# Altium footprint library vertigo.PcbLib: 115 footprints (part 2 of 8)
Each footprint in its own frame and in the unit in brackets; x right, y up, seen from the top. Pads: shape width x height; smd on the part's side, far side on the other; paste and mask are expansions set on the pad; w line width, h text height; cw(c..) or ccw(c..) is an arc to the next point about the centre after c.
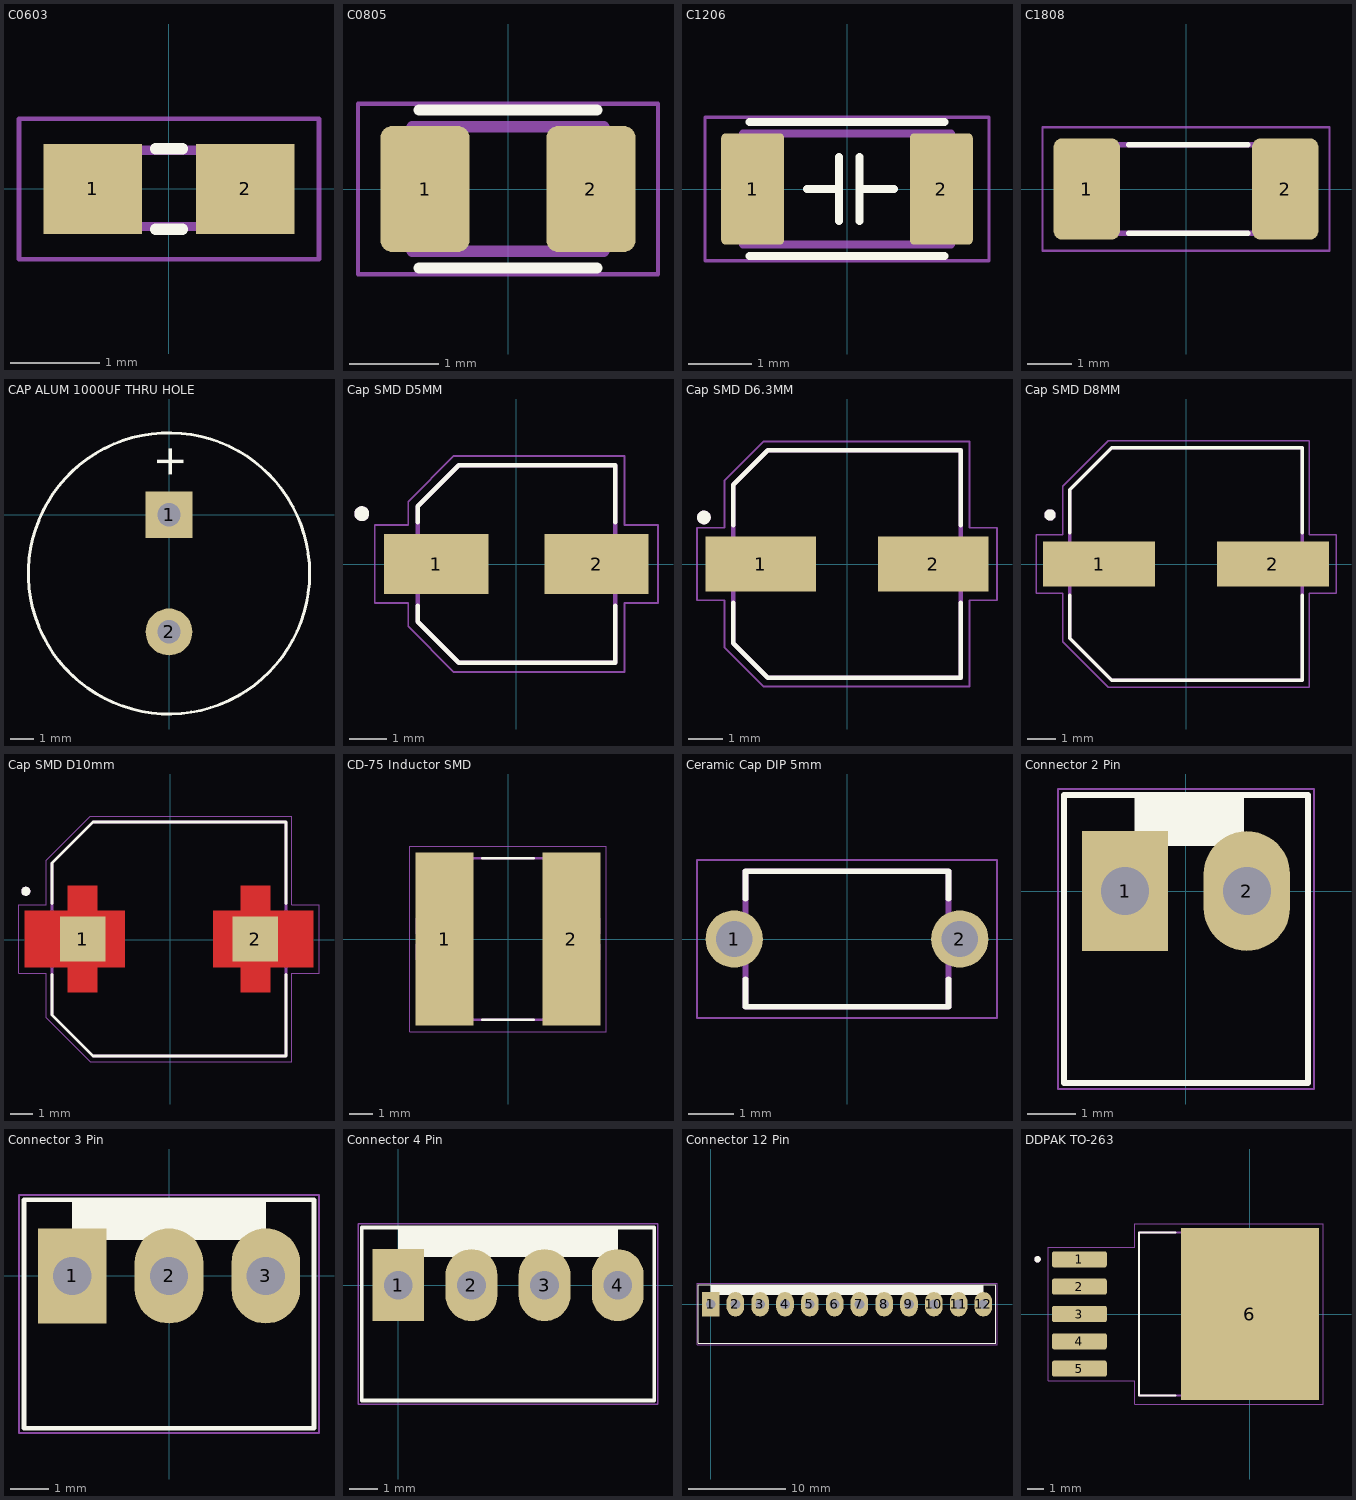
[diagram p1: the footprints below, top view; thin cyan lines are the x and y axes]

## C0603 [mm] "0603 SMD Package"
pads (2):
  rect 1.1x1 smd: 1(-0.85,0) 2(0.85,0)
Top Overlay:
  lines w0.127: -0.15,-0.45 0.15,-0.45 ; -0.15,0.45 0.15,0.45
Mechanical 13:
  region: -0.338,-0.47 -0.839,-0.47 -0.839,0.48 -0.338,0.48
  region: 0.83,-0.471 0.331,-0.471 0.331,0.48 0.83,0.48
  lines w0.102: -0.356,-0.419 0.356,-0.419 ; -0.356,0.432 0.356,0.432
Mechanical 15:
  lines w0.051: -1.673,-0.783 1.673,-0.783 1.673,0.783 -1.673,0.783 -1.673,-0.783
3D body "LD034C222KAB2A.STEP": height 0.41, standoff -0.41, extent -0.8,-0.419 0.8,0.481

## C0805 [mm]
pads (2):
  rrect25% 1x1.42 smd: 1(-0.935,0) 2(0.935,0)
Top Overlay:
  lines w0.127: -1,-0.89 1,-0.89 ; -1,0.89 1,0.89
Mechanical 13:
  lines w0.127: -1.08,-0.7 -1.08,0.7 1.08,0.7 1.08,-0.7 -1.08,-0.7
Mechanical 15:
  lines w0.05: -1.69,-0.96 -1.69,0.96 1.69,0.96 1.69,-0.96 -1.69,-0.96
3D body "LD051C473KAB2A(0.STEP": height 0.94, standoff 0, extent -1.005,-0.625 1.005,0.625

## C1206 [mm] "1206 Package"
pads (2):
  rrect14% 1x1.77 smd: 1(-1.5,0) 2(1.5,0)
Top Overlay:
  lines w0.127: -1.55,-1.065 1.55,-1.065 ; -1.55,1.065 1.55,1.065 ; -0.635,0 -0.127,0 ; -0.127,-0.508 -0.127,0.508 ; 0.2,-0.508 0.2,0.508 ; 0.2,0 0.75,0
Mechanical 13:
  lines w0.127: -1.65,-0.88 1.65,-0.88 1.65,0.88 -1.65,0.88 -1.65,-0.88
Mechanical 15:
  lines w0.05: -2.26,-1.14 2.26,-1.14 2.26,1.14 -2.26,1.14 -2.26,-1.14
3D body "LD06YC106MAB2A.STEP": height 0.94, standoff 0, extent -1.6,-0.8 1.6,0.8

## C1808 [mm]
pads (2):
  rrect25% 1.5x2.3 smd: 1(-2.25,0) 2(2.25,0)
Top Overlay:
  lines w0.127: -1.3,-1 1.4,-1 ; -1.3,1 1.4,1
Mechanical 13:
  lines w0.127: -2.25,-1 -1.65,-1 1.65,-1 2.25,-1 2.25,1 1.65,1 -1.65,1 -2.25,1 -2.25,-1
Mechanical 15:
  lines w0.05: -3.25,-1.4 -3.25,1.4 3.25,1.4 3.25,-1.4 -3.25,-1.4
3D body "step_temp.STEP": height 1.6, standoff 0, extent -2.25,-1.015 2.25,1.015

## CAP ALUM 1000UF THRU HOLE [mm]
pads (2):
  rect 2x2 hole 1: 1(0,0)
  round 2 hole 1: 2(0,-5)
Top Overlay:
  circle w0.127: c0,-2.5 r6
  text "+" at -0.5,3 h1.3
3D body "CAP-12x15.STEP": height 15.01, standoff -2.7, extent -6.275,-8.706 6.225,3.75

## Cap SMD D5MM [mm] "Diameter 5mm"
pads (2):
  rect 2.8x1.6 smd: 1(-2.15,0) 2(2.15,0)
Top Overlay:
  circle w0.2: c-4.15,1.35 r0.1
  lines w0.127: -2.65,-1.12 -2.65,-1.55 -1.55,-2.65 2.65,-2.65 2.65,-1.12 ; -2.65,1.12 -2.65,1.55 -1.55,2.65 2.65,2.65 2.65,1.12
Mechanical 13:
  circle w0.2: c-4.15,1.35 r0.1
  lines w0.127: -2.65,-1.55 -1.55,-2.65 2.65,-2.65 2.65,2.65 -1.55,2.65 -2.65,1.55 -2.65,-1.55
Mechanical 15:
  lines w0.05: -3.8,-1.05 -3.8,1.05 -2.9,1.05 -2.9,1.675 -1.675,2.9 2.9,2.9 2.9,1.05 3.8,1.05 3.8,-1.05 2.9,-1.05 2.9,-2.9 -1.675,-2.9 -2.9,-1.675 -2.9,-1.05 -3.8,-1.05
3D body "step_temp.STEP": height 5.8, standoff 0, extent -3,-2.65 3,2.65

## Cap SMD D6.3MM [mm] "Diameter 6.3mm"
pads (2):
  rect 3.2x1.6 smd: 1(-2.5,0) 2(2.5,0)
Top Overlay:
  circle w0.2: c-4.15,1.35 r0.1
  lines w0.127: -3.3,-1.12 -3.3,-2.3 -2.3,-3.3 3.3,-3.3 3.3,-1.12 ; -3.3,1.12 -3.3,2.3 -2.3,3.3 3.3,3.3 3.3,1.12
Mechanical 13:
  circle w0.2: c-4.15,1.35 r0.1
  lines w0.127: -3.3,-2.3 -3.3,2.3 -2.3,3.3 3.3,3.3 3.3,-3.3 -2.3,-3.3 -3.3,-2.3
Mechanical 15:
  lines w0.05: -4.35,-1.05 -3.55,-1.05 -3.55,-2.425 -2.425,-3.55 3.55,-3.55 3.55,-1.05 4.35,-1.05 4.35,1.05 3.55,1.05 3.55,3.55 -2.425,3.55 -3.55,2.425 -3.55,1.05 -4.35,1.05 -4.35,-1.05
3D body "step_temp.STEP": height 5.8, standoff 0, extent -3.65,-3.3 3.65,3.3

## Cap SMD D8MM [mm] "Diameter 8mm"
pads (2):
  rect 4x1.6 smd: 1(-3.1,0) 2(3.1,0)
Top Overlay:
  circle w0.2: c-4.85,1.75 r0.1
  lines w0.127: -4.15,-1.12 -4.15,-2.65 -2.65,-4.15 4.15,-4.15 4.15,-1.12 ; -4.15,1.12 -4.15,2.65 -2.65,4.15 4.15,4.15 4.15,1.12
Mechanical 13:
  circle w0.2: c-4.85,1.75 r0.1
  lines w0.127: -4.15,-2.65 -4.15,2.65 -2.65,4.15 4.15,4.15 4.15,-4.15 -2.65,-4.15 -4.15,-2.65
Mechanical 15:
  lines w0.05: -5.35,-1.05 -4.4,-1.05 -4.4,-2.775 -2.775,-4.4 4.4,-4.4 4.4,-1.05 5.35,-1.05 5.35,1.05 4.4,1.05 4.4,4.4 -2.775,4.4 -4.4,2.775 -4.4,1.05 -5.35,1.05 -5.35,-1.05
3D body "step_temp.STEP": height 6.2, standoff 0, extent -4.5,-4.15 4.5,4.15

## Cap SMD D10mm [mm] "Diameter 10mm"
pads (2):
  rect 2x2 smd paste-2 mask+0: 1(-3.853,0.037) 2(3.747,0.037)
Top Layer:
  region: 4.397,1.287 6.297,1.287 6.297,-1.213 4.397,-1.213 4.397,-2.313 3.097,-2.313 3.097,-1.213 1.897,-1.213 1.897,1.287 3.097,1.287 3.097,2.387 4.397,2.387
  region: -3.203,1.287 -2.003,1.287 -2.003,-1.213 -3.203,-1.213 -3.203,-2.313 -4.503,-2.313 -4.503,-1.213 -6.403,-1.213 -6.403,1.287 -4.503,1.287 -4.503,2.387 -3.203,2.387
Top Overlay:
  circle w0.2: c-6.353,2.137 r0.1
  lines w0.127: -5.203,-1.533 -5.203,-3.313 -3.403,-5.113 5.097,-5.113 5.097,-1.533 ; -5.203,1.607 -5.203,3.387 -3.403,5.187 5.097,5.187 5.097,1.607
Top Paste:
  region: 4.397,1.287 6.297,1.287 6.297,-1.213 4.397,-1.213 4.397,-2.313 3.097,-2.313 3.097,-1.213 1.897,-1.213 1.897,1.287 3.097,1.287 3.097,2.387 4.397,2.387
  region: -3.203,1.287 -2.003,1.287 -2.003,-1.213 -3.203,-1.213 -3.203,-2.313 -4.503,-2.313 -4.503,-1.213 -6.403,-1.213 -6.403,1.287 -4.503,1.287 -4.503,2.387 -3.203,2.387
Top Solder:
  region: 4.497,1.387 6.397,1.387 6.397,-1.313 4.497,-1.313 4.497,-2.413 2.997,-2.413 2.997,-1.313 1.797,-1.313 1.797,1.387 2.997,1.387 2.997,2.487 4.497,2.487
  region: -3.103,1.387 -1.903,1.387 -1.903,-1.313 -3.103,-1.313 -3.103,-2.413 -4.603,-2.413 -4.603,-1.313 -6.503,-1.313 -6.503,1.387 -4.603,1.387 -4.603,2.487 -3.103,2.487
Mechanical 13:
  circle w0.2: c-6.353,2.137 r0.1
  lines w0.127: -5.203,-3.313 -5.203,3.387 -3.403,5.187 5.097,5.187 5.097,-5.113 -3.403,-5.113 -5.203,-3.313
Mechanical 15:
  lines w0.05: -6.653,-1.463 -5.453,-1.463 -5.453,-3.438 -3.528,-5.363 5.347,-5.363 5.347,-1.463 6.547,-1.463 6.547,1.537 5.347,1.537 5.347,5.437 -3.528,5.437 -5.453,3.512 -5.453,1.537 -6.653,1.537 -6.653,-1.463
3D body "step_temp.STEP": height 10.5, standoff 0, extent -5.903,-5.113 5.797,5.187

## CD-75 Inductor SMD [mm]
pads (2):
  rect 2.5x7.5 smd: 1(-2.75,0) 2(2.75,0)
Top Overlay:
  lines w0.127: -1.1,-3.5 1.1,-3.5 ; -1.1,3.5 1.1,3.5
Mechanical 13:
  lines w0.127: -3.896,-0.023 cw(c-0.95,0.55) -1.523,3.496 ; -3.896,0.023 ccw(c-0.95,-0.55) -1.523,-3.496 ; -1.5,-3.5 1.5,-3.5 ; -1.5,3.5 1.5,3.5 ; 1.523,-3.496 ccw(c0.95,-0.55) 3.896,0.023 ; 1.523,3.496 cw(c0.95,0.55) 3.896,-0.023
Mechanical 15:
  lines w0.05: -4.25,-4.01 -4.25,4.01 4.25,4.01 4.25,-4.01 -4.25,-4.01
3D body "RLS-686-R--3DModel-STEP-1.STEP": height 4.9, standoff -0.1, extent -3.868,-3.5 3.868,3.5

## Ceramic Cap DIP 5mm [mm] "DIP 5mm"
pads (2):
  round 1.27 hole 0.8: 1(-2.5,0) 2(2.5,0)
Top Overlay:
  lines w0.127: -2.25,-0.895 -2.25,-1.5 2.25,-1.5 2.25,-0.895 ; -2.25,0.895 -2.25,1.5 2.25,1.5 2.25,0.895
Mechanical 13:
  lines w0.127: -2.25,-1.5 -2.25,1.5 2.25,1.5 2.25,-1.5 -2.25,-1.5
Mechanical 15:
  lines w0.05: -3.325,-1.75 -3.325,1.75 3.325,1.75 3.325,-1.75 -3.325,-1.75
3D body "step_temp.STEP": height 7.75, standoff -6.75, extent -2.241,-1.5 2.242,1.5

## Connector 2 Pin [mm]
pads (2):
  rect 1.8x2.5 hole 1: 1(-1.27,0)
  oval 1.8x2.5 hole 1: 2(1.27,0)
Top Overlay:
  rectangle: -1.069,0.942 1.206,1.974
  lines w0.127: -2.54,-4 -2.54,2 2.54,2 2.54,-4 -2.54,-4
Mechanical 15:
  lines w0.05: -2.667,-4.127 2.668,-4.127 2.668,2.127 -2.667,2.127 -2.667,-4.127
3D body "mokhaberati_2.STEP": height 11, standoff -3, extent -2.54,-4 2.54,2

## Connector 3 Pin [mm]
pads (3):
  rect 1.8x2.5 hole 1: 1(-2.54,0)
  oval 1.8x2.5 hole 1: 2(0,0) 3(2.54,0)
Top Overlay:
  rectangle: -2.54,0.942 2.54,1.974
  lines w0.127: -3.81,-4 3.81,-4 3.81,2 -3.81,2 -3.81,-4
Mechanical 15:
  lines w0.05: -3.937,-4.127 3.937,-4.127 3.937,2.127 -3.937,2.127 -3.937,-4.127
3D body "mokhaberati_3.STEP": height 11, standoff -3, extent -3.81,-4 3.81,2

## Connector 4 Pin [mm]
pads (4):
  rect 1.8x2.5 hole 1: 1(0,0)
  oval 1.8x2.5 hole 1: 2(2.54,0) 3(5.08,0) 4(7.62,0)
Top Overlay:
  rectangle: 0,0.973 7.62,2.032
  lines w0.127: -1.27,-4 8.89,-4 8.89,2 -1.27,2 -1.27,-4
Mechanical 15:
  lines w0.05: -1.397,-4.127 -1.397,2.127 9.017,2.127 9.017,-4.127 -1.397,-4.127
3D body "mokhaberati_4.STEP": height 11, standoff -3, extent -1.27,-4 8.89,2

## Connector 12 Pin [mm]
pads (12):
  rect 1.8x2.5 hole 1: 1(0,0)
  oval 1.8x2.5 hole 1: 2(2.54,0) 3(5.08,0) 4(7.62,0) 5(10.16,0) 6(12.7,0) 7(15.24,0) 8(17.78,0) 9(20.32,0) 10(22.86,0) 11(25.4,0) 12(27.94,0)
Top Overlay:
  rectangle: 0,0.942 27.94,1.974
  lines w0.127: -1.27,-4 -1.27,2 29.21,2 29.21,-4 -1.27,-4
Mechanical 15:
  lines w0.05: -1.397,-4.127 -1.397,2.127 29.337,2.127 29.337,-4.127 -1.397,-4.127
3D body "mokhaberati_12.STEP": height 11, standoff -3, extent -1.27,-4 29.21,2

## DDPAK TO-263 [mm] "TO-263 Package"
pads (6):
  rrect25% 3.4x1 smd: 1(-10.6,3.4) 2(-10.6,1.7) 3(-10.6,0) 4(-10.6,-1.7) 5(-10.6,-3.4)
  rect 8.6x10.7 smd: 6(0,0)
Top Overlay:
  circle w0.2: c-13.2,3.4 r0.1
  lines w0.127: -4.62,-5.08 -6.905,-5.08 -6.905,5.08 -4.62,5.08
Mechanical 13:
  circle w0.2: c-13.2,3.4 r0.1
  lines w0.127: -6.905,-5.08 2.02,-5.08 2.02,5.08 -6.905,5.08 -6.905,-5.08
Mechanical 15:
  lines w0.05: -12.55,-4.15 -12.55,4.15 -7.155,4.15 -7.155,5.6 4.55,5.6 4.55,-5.6 -7.155,-5.6 -7.155,-4.15 -12.55,-4.15
3D body "NOPB.STEP": height 4.65, standoff -0.15, extent -11.425,-5.08 2.926,5.08